# Altium footprint library YQPOWER.PcbLib: 215 footprints (part 9 of 14)
Each footprint in its own frame and in the unit in brackets; x right, y up, seen from the top. Pads: shape width x height; smd on the part's side, far side on the other; paste and mask are expansions set on the pad; w line width, h text height; cw(c..) or ccw(c..) is an arc to the next point about the centre after c.
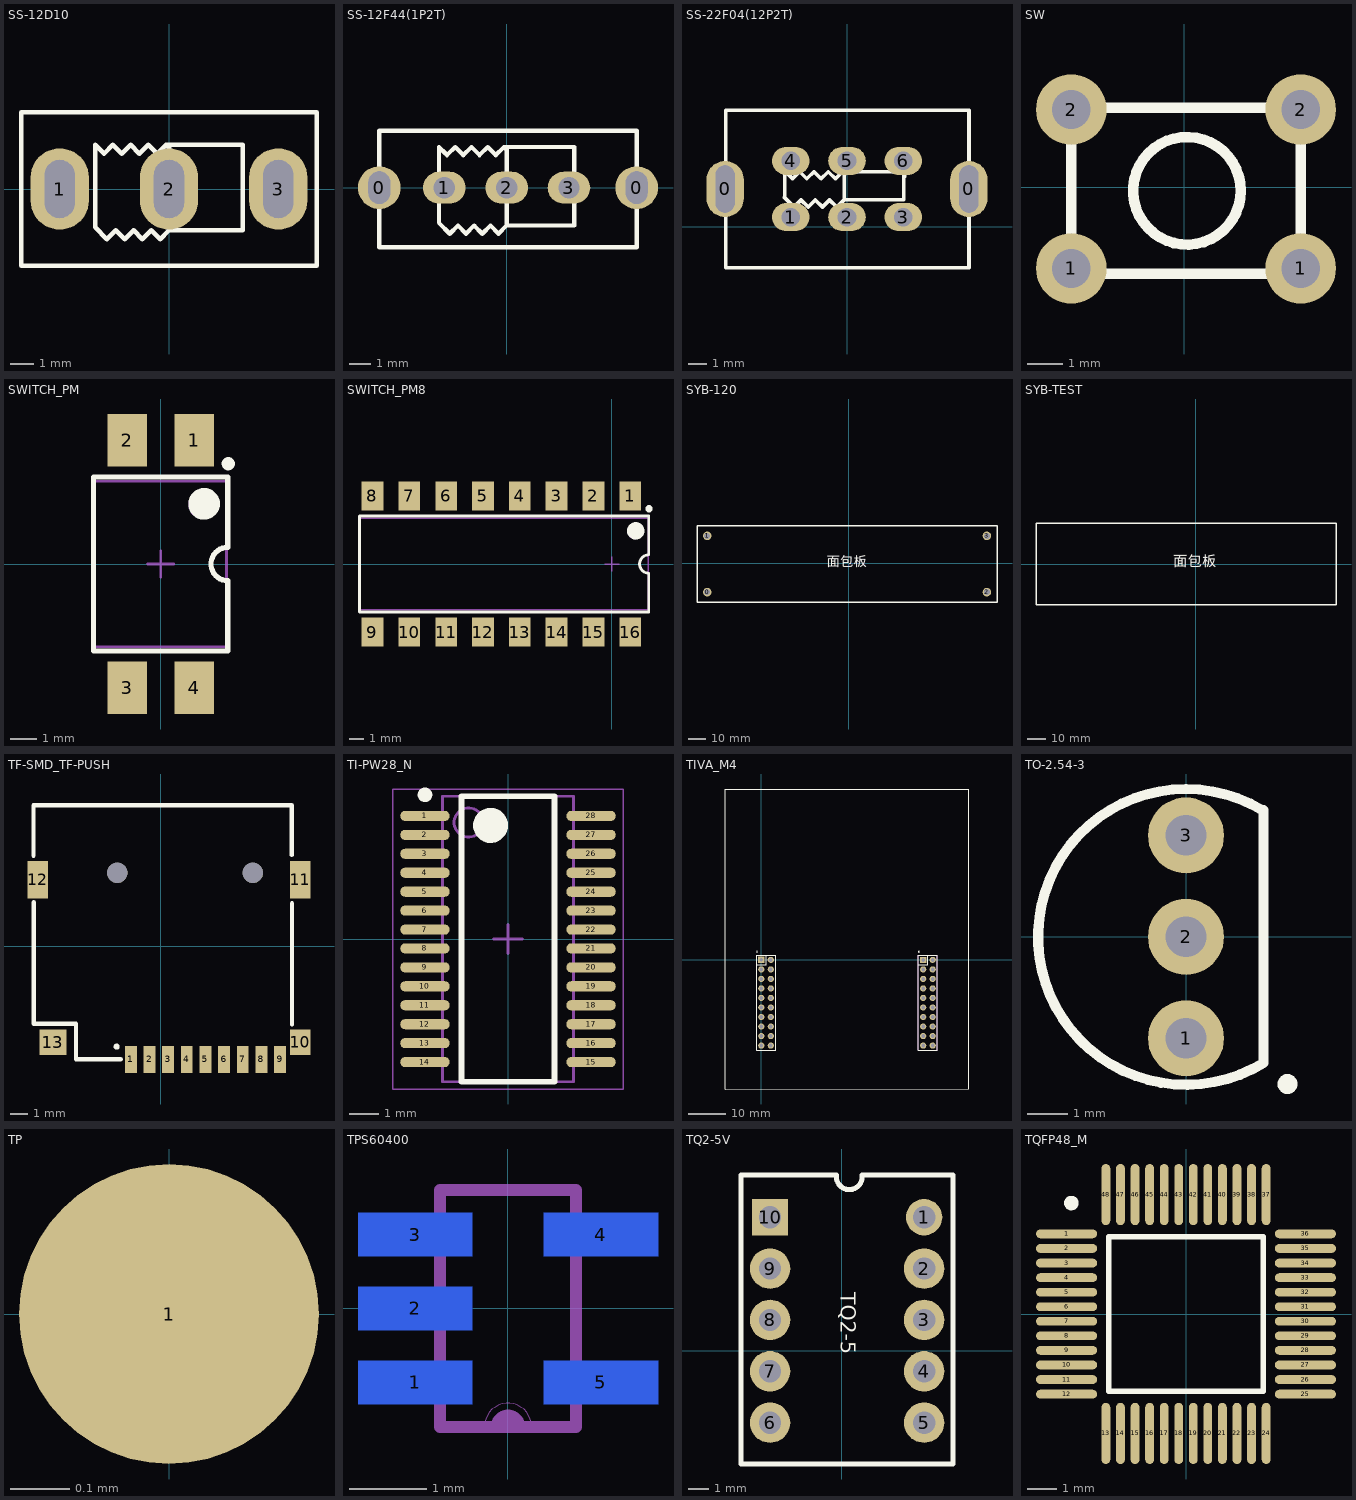
[diagram p8: the footprints below, top view; thin cyan lines are the x and y axes]

## SS-12D10 [mm]
pads (3):
  oval 2.5x3.5 hole 1.3 slot 2.5 at 90 deg: 1(-4.699,0) 2(0,0) 3(4.699,0)
Top Overlay:
  lines w0.2: -2.857,1.587 -3.175,1.905 -3.175,-1.651 -2.667,-2.159 -2.286,-1.778 -1.905,-2.159 -1.524,-1.778 -1.143,-2.159 -0.762,-1.778 -0.381,-2.159 0,-1.778 ; -2.794,1.524 -2.413,1.905 -2.032,1.524 -1.651,1.905 -1.27,1.524 -0.889,1.905 -0.508,1.524 -0.127,1.905 ; -0.127,1.905 3.175,1.905 3.175,1.651 3.175,-1.778 0,-1.778 ; -0.127,1.905 0,1.778 0,-1.778 ; -6.35,-3.302 -6.35,3.302 6.35,3.302 6.35,-3.302 -6.35,-3.302

## SS-12F44(1P2T) [mm]
pads (5):
  round 2 hole 1.016 slot 1.524 at 90 deg: 0(-5.969,0) 0(6.096,0)
  oval 2x1.5 hole 1: 1(-2.921,0) 2(0,0) 3(2.921,0)
Top Overlay:
  lines w0.2: -2.857,1.587 -3.175,1.905 -3.175,-1.651 -2.667,-2.159 -2.286,-1.778 -1.905,-2.159 -1.524,-1.778 -1.143,-2.159 -0.762,-1.778 -0.381,-2.159 0,-1.778 ; -2.794,1.524 -2.413,1.905 -2.032,1.524 -1.651,1.905 -1.27,1.524 -0.889,1.905 -0.508,1.524 -0.127,1.905 ; -0.127,1.905 3.175,1.905 3.175,1.651 3.175,-1.778 0,-1.778 ; -0.127,1.905 0,1.778 0,-1.778 ; -5.969,-2.794 -5.969,2.667 6.096,2.667 6.096,-2.794 -5.969,-2.794

## SS-22F04(12P2T) [mm]
height 5.563
pads (8):
  oval 2x3 hole 1.016 slot 2.524 at 90 deg: 0(-6.5,2) 0(6.5,2)
  oval 2x1.5 hole 1: 1(-3,0.5) 2(0,0.5) 3(3,0.5) 4(-3,3.5) 5(0,3.5) 6(3,3.5)
Top Overlay:
  lines w0.2: -3.34,1.547 -2.832,1.039 -2.451,1.42 -2.07,1.039 -1.689,1.42 -1.308,1.039 -0.927,1.42 -0.546,1.039 -0.165,1.42 3.01,1.42 ; -3.325,1.547 -3.325,2.925 ; -3.285,2.925 -2.967,2.607 ; -2.904,2.544 -2.523,2.925 -2.142,2.544 -1.761,2.925 -1.38,2.544 -0.999,2.925 -0.618,2.544 -0.237,2.925 ; -0.15,1.42 -0.15,2.861 ; -0.11,2.798 -0.237,2.925 ; 3.025,1.42 3.025,2.925 ; 3.065,2.671 3.065,2.925 -0.237,2.925 ; -6.47,-2.2 -6.47,6.2 6.5,6.2 6.5,-2.2 -6.47,-2.2

## SW [mm]
pads (4):
  round 2 hole 1.1: 1(-3.2,-2.3) 1(3.3,-2.3) 2(-3.2,2.2) 2(3.3,2.2)
Top Overlay:
  circle w0.3: c0.076,-0.102 r1.524
  lines w0.3: -3.2,-2.452 -3.2,2.248 3.3,2.248 3.3,-2.452 -3.2,-2.452

## SWITCH_PM [mm] "波码开关"
pads (4):
  rect 1.5x2 smd: 1(1.27,4.699) 2(-1.27,4.699) 3(-1.27,-4.699) 4(1.27,-4.699)
Top Overlay:
  circle w0.25: c2.57,3.81 r0.125
  circle w0.6: c1.651,2.286 r0.3
  lines w0.2: -2.55,-3.302 2.55,-3.302 2.55,-0.635 cw(c2.55,0) 2.55,0.635 2.55,3.302 -2.55,3.302 -2.55,-3.302
Mechanical 13:
  circle w0.1: c1.6,2.25 r0.5
  lines w0.1: -2.5,-3.15 2.5,-3.15 2.5,3.15 -2.5,3.15 -2.5,-3.15
Mechanical 15:
  lines w0.1: -0.5,0 0.5,0 ; 0,-0.5 0,0.5
3D body: height 5.6, standoff 0, extent -2.5,-3.15 2.5,3.15

## SWITCH_PM8 [mm]
pads (16):
  rect 1.5x2 smd: 1(1.27,4.699) 2(-1.27,4.699) 3(-3.81,4.699) 4(-6.35,4.699) 5(-8.89,4.699) 6(-11.43,4.699) 7(-13.97,4.699) 8(-16.51,4.699) 9(-16.51,-4.699) 10(-13.97,-4.699) 11(-11.43,-4.699) 12(-8.89,-4.699) 13(-6.35,-4.699) 14(-3.81,-4.699) 15(-1.27,-4.699) 16(1.27,-4.699)
Top Overlay:
  circle w0.25: c2.57,3.81 r0.125
  circle w0.6: c1.651,2.286 r0.3
  lines w0.2: -17.399,-3.302 2.55,-3.302 2.55,-0.635 cw(c2.55,0) 2.55,0.635 2.55,3.302 -17.399,3.302 -17.399,-3.302
Mechanical 13:
  circle w0.1: c1.6,2.25 r0.5
  lines w0.1: -17.399,-3.15 2.5,-3.15 2.5,3.15 -17.399,3.15 -17.399,-3.15
Mechanical 15:
  lines w0.1: -0.5,0 0.5,0 ; 0,-0.5 0,0.5
3D body: height 5.6, standoff 0, extent -17.399,-3.15 2.5,3.15

## SYB-120 [mm]
pads (4):
  round 5 hole 3.5: 0(-82.931,-16.871) 1(-82.931,16.129) 2(81.069,-16.871) 3(81.069,16.129)
Top Overlay:
  lines w0.762: -88.931,22.129 85.217,22.129 86.995,22.129 ; -88.773,22.129 -88.931,21.971 -88.931,-9.251 -88.931,-22.871 -70.231,-22.871 86.995,-22.871 86.995,21.971
  text "面包板" at -12.827,-3.683 h10

## SYB-TEST [mm]
Top Overlay:
  lines w0.762: -88.55,22.51 77.724,22.51 77.724,-22.49 -69.85,-22.49 -88.55,-22.49 -88.55,-8.87 -88.55,22.352 -88.392,22.51
  text "面包板" at -12.446,-3.302 h10

## TF-SMD_TF-PUSH [mm]
pads (15):
  rect 0.7x1.6 smd: 1(-1.77,-6.67) 2(-0.67,-6.67) 3(0.43,-6.67) 4(1.53,-6.67) 5(2.63,-6.67) 6(3.73,-6.67) 7(4.83,-6.67) 8(5.93,-6.67) 9(7.03,-6.67)
  rect 1.2x1.5 smd: 10(8.23,-5.67)
  rect 1.2x2.2 smd: 11(8.23,3.93) 12(-7.27,3.93)
  rect 1.6x1.5 smd: 13(-6.37,-5.67)
  round 1.2 hole 1.2 unplated: ""(-2.57,4.33) ""(5.43,4.33)
Top Overlay:
  circle w0.254: c-2.607,-5.922 r0.052
  lines w0.254: -7.52,5.34 -7.52,8.33 7.72,8.33 7.72,5.39 ; -7.5,2.599 -7.5,-4.57 -5.01,-4.57 ; -5.02,-4.57 -5.009,-4.569 -5.009,-6.67 -4.222,-6.67 ; -4.222,-6.67 -2.37,-6.67 ; 7.74,-4.62 7.74,2.54

## TI-PW28_N [mm] "SOP, 28-Leads, Body 9.7x4.4mm, Pitch 0.65mm, IPC Medium Density"
height 1.2
pads (28):
  oval 1.7x0.35 smd: 1(-2.85,4.225) 2(-2.85,3.575) 3(-2.85,2.925) 4(-2.85,2.275) 5(-2.85,1.625) 6(-2.85,0.975) 7(-2.85,0.325) 8(-2.85,-0.325) 9(-2.85,-0.975) 10(-2.85,-1.625) 11(-2.85,-2.275) 12(-2.85,-2.925) 13(-2.85,-3.575) 14(-2.85,-4.225) 15(2.85,-4.225) 16(2.85,-3.575) 17(2.85,-2.925) 18(2.85,-2.275) 19(2.85,-1.625) 20(2.85,-0.975) 21(2.85,-0.325) 22(2.85,0.325) 23(2.85,0.975) 24(2.85,1.625) 25(2.85,2.275) 26(2.85,2.925) 27(2.85,3.575) 28(2.85,4.225)
Top Overlay:
  circle w0.6: c-0.6,3.9 r0.3
  circle w0.25: c-2.85,4.95 r0.125
  lines w0.2: -1.6,-4.9 1.6,-4.9 1.6,4.9 -1.6,4.9 -1.6,-4.9
Mechanical 13:
  circle w0.1: c-1.35,4 r0.5
  lines w0.1: -2.25,-4.9 2.25,-4.9 2.25,4.9 -2.25,4.9 -2.25,-4.9
Mechanical 15:
  lines w0.05: -3.95,-5.15 3.95,-5.15 3.95,5.15 -3.95,5.15 -3.95,-5.15
  lines w0.1: -0.5,0 0.5,0 ; 0,-0.5 0,0.5
3D body: height 1.2, standoff 0.05, extent -2.25,-4.9 2.25,4.9

## TIVA_M4 [mm] "Samtec 100mil, 2x10, 230 mil above insulator"
height 8.382
pads (40):
  rect 1.65x1.65 hole 1.016 mask+0: 1(0,0) 21(43.18,-0.029)
  round 1.65 hole 1.016 mask+0: 2(0,-2.569) 3(0,-5.109) 4(0,-7.649) 5(0,-10.189) 6(0,-12.729) 7(0,-15.269) 8(0,-17.809) 9(0,-20.349) 10(0,-22.889) 11(2.54,-0.029) 12(2.54,-2.569) 13(2.54,-5.109) 14(2.54,-7.649) 15(2.54,-10.189) 16(2.54,-12.729) 17(2.54,-15.269) 18(2.54,-17.809) 19(2.54,-20.349) 20(2.54,-22.889) 22(43.18,-2.569) 23(43.18,-5.109) 24(43.18,-7.649) 25(43.18,-10.189) 26(43.18,-12.729) 27(43.18,-15.269) 28(43.18,-17.809) 29(43.18,-20.349) 30(43.18,-22.889) 31(45.72,-0.029) 32(45.72,-2.569) 33(45.72,-5.109) 34(45.72,-7.649) 35(45.72,-10.189) 36(45.72,-12.729) 37(45.72,-15.269) 38(45.72,-17.809) 39(45.72,-20.349) 40(45.72,-22.889)
Top Overlay:
  circle w0.25: c42.05,2.141 r0.125
  circle w0.25: c-1.13,2.141 r0.125
  lines w0.125: 55.362,-34.467 -9.638,-34.467 -9.638,45.533 55.362,45.533 55.362,-34.452
  lines w0.178: -1.27,-1.299 1.27,-1.299 1.27,1.241 ; 41.91,-1.299 44.45,-1.299 44.45,1.241 ; -1.27,-24.159 3.81,-24.159 3.81,1.241 -1.27,1.241 -1.27,-24.159 ; 41.91,-24.159 46.99,-24.159 46.99,1.241 41.91,1.241 41.91,-24.159
Mechanical 5:
  region: 42.672,0.479 42.672,-0.537 43.688,-0.537 43.688,0.479
  region: -0.508,0.479 -0.508,-0.537 0.508,-0.537 0.508,0.479
  lines w0.127: -1.27,-24.159 -1.27,1.241 3.81,1.241 3.81,-24.159 -1.27,-24.159 ; 41.91,-24.159 41.91,1.241 46.99,1.241 46.99,-24.159 41.91,-24.159
  text ".Designator" at 44.044,-10.011 h1.02
  text ".Designator" at 0.762,-9.935 h1.02
3D body "SamtecTSW-07_10x2.stp": height 8.38, standoff -2.54, extent 41.91,-24.159 46.99,1.241
3D body "SamtecTSW-07_10x2.stp": height 8.38, standoff -2.54, extent -1.27,-24.159 3.81,1.241

## TO-2.54-3 [mil]
height 200
pads (3):
  round 75 hole 40: 1(0,-100) 2(0,0) 3(0,100)
Top Overlay:
  circle w9.84: c100.08,-145 r4.92
  lines w10: 75,125 ccw(c0,0) 76.4,-124.15 76.4,125

## TP [mil] "test point"
pads (1):
  round 20 smd mask+2: 1(0,0)

## TPS60400 [mil] "SOT (DBV)"
pads (5):
  rect 58x22 smd far side: 1(-47,-37.4) 2(-47,0) 3(-47,37.4) 4(47,37.4) 5(47,-37.4)
Bottom Overlay:
  lines w6: -11.91,-60 11.91,-60 ; -11.91,60 11.91,60 ; -4.92,-49.05 cw(c0,-60) 4.92,-49.05 ; 34.5,-13.3 34.5,13.3
Mechanical 1:
  lines w0: -12,-60 cw(c0,-60) 12,-60 ; -59,-47.4 -34.5,-47.4 -34.5,-27.4 -59,-27.4 -59,-47.4 ; -59,-10 -34.5,-10 -34.5,10 -59,10 -59,-10 ; -59,27.4 -34.5,27.4 -34.5,47.4 -59,47.4 -59,27.4 ; -34.5,-60 34.5,-60 34.5,60 -34.5,60 -34.5,-60 ; 34.5,-47.4 34.5,-27.4 59,-27.4 59,-47.4 34.5,-47.4 ; 34.5,27.4 34.5,47.4 59,47.4 59,27.4 34.5,27.4
  lines w6: -5.75,-60 cw(c0,-60) 5.75,-60 ; -34.5,-60 -34.5,60 34.5,60 34.5,-60 -34.5,-60

## TQ2-5V [mm]
pads (10):
  round 1.8 hole 1.1: 1(4.064,6.604)
  round 2 hole 1.1: 2(4.064,4.064) 3(4.064,1.524) 4(4.064,-1.016) 5(4.064,-3.556) 6(-3.556,-3.556) 7(-3.556,-1.016) 8(-3.556,1.524) 9(-3.556,4.064)
  rect 1.8x1.8 hole 1.1: 10(-3.556,6.604)
Top Overlay:
  lines w0.254: -0.27,8.6 ccw(c0.365,8.6) 1,8.6 ; -0.27,8.7 -5,8.7 -5,-5.6 5.5,-5.6 5.5,8.7 1,8.7
  text "TQ2-5" at -0.3,2.9 h1.27

## TQFP48_M [mm] "48-Pin Thin Quad Flat Pack 0.5 mm Pitch, IPC Low Density"
height 1.6
pads (48):
  oval 2.1x0.3 smd: 1(-4.1,2.75) 2(-4.1,2.25) 3(-4.1,1.75) 4(-4.1,1.25) 5(-4.1,0.75) 6(-4.1,0.25) 7(-4.1,-0.25) 8(-4.1,-0.75) 9(-4.1,-1.25) 10(-4.1,-1.75) 11(-4.1,-2.25) 12(-4.1,-2.75) 25(4.1,-2.75) 26(4.1,-2.25) 27(4.1,-1.75) 28(4.1,-1.25) 29(4.1,-0.75) 30(4.1,-0.25) 31(4.1,0.25) 32(4.1,0.75) 33(4.1,1.25) 34(4.1,1.75) 35(4.1,2.25) 36(4.1,2.75)
  oval 0.3x2.1 smd: 13(-2.75,-4.1) 14(-2.25,-4.1) 15(-1.75,-4.1) 16(-1.25,-4.1) 17(-0.75,-4.1) 18(-0.25,-4.1) 19(0.25,-4.1) 20(0.75,-4.1) 21(1.25,-4.1) 22(1.75,-4.1) 23(2.25,-4.1) 24(2.75,-4.1) 37(2.75,4.1) 38(2.25,4.1) 39(1.75,4.1) 40(1.25,4.1) 41(0.75,4.1) 42(0.25,4.1) 43(-0.25,4.1) 44(-0.75,4.1) 45(-1.25,4.1) 46(-1.75,4.1) 47(-2.25,4.1) 48(-2.75,4.1)
Top Overlay:
  circle w0.25: c-3.937,3.81 r0.125
  lines w0.2: -2.65,-2.65 -2.65,2.65 2.65,2.65 2.65,-2.65 -2.65,-2.65
3D body "User Library-LQFP48_Grid_0_5.STEP": height 1.6, standoff 0, extent -4.5,-4.5 4.5,4.5